# Altium footprint library 3.22-杂项.PcbLib: 199 footprints (part 14 of 15)
Each footprint in its own frame and in the unit in brackets; x right, y up, seen from the top. Pads: shape width x height; smd on the part's side, far side on the other; paste and mask are expansions set on the pad; w line width, h text height; cw(c..) or ccw(c..) is an arc to the next point about the centre after c.
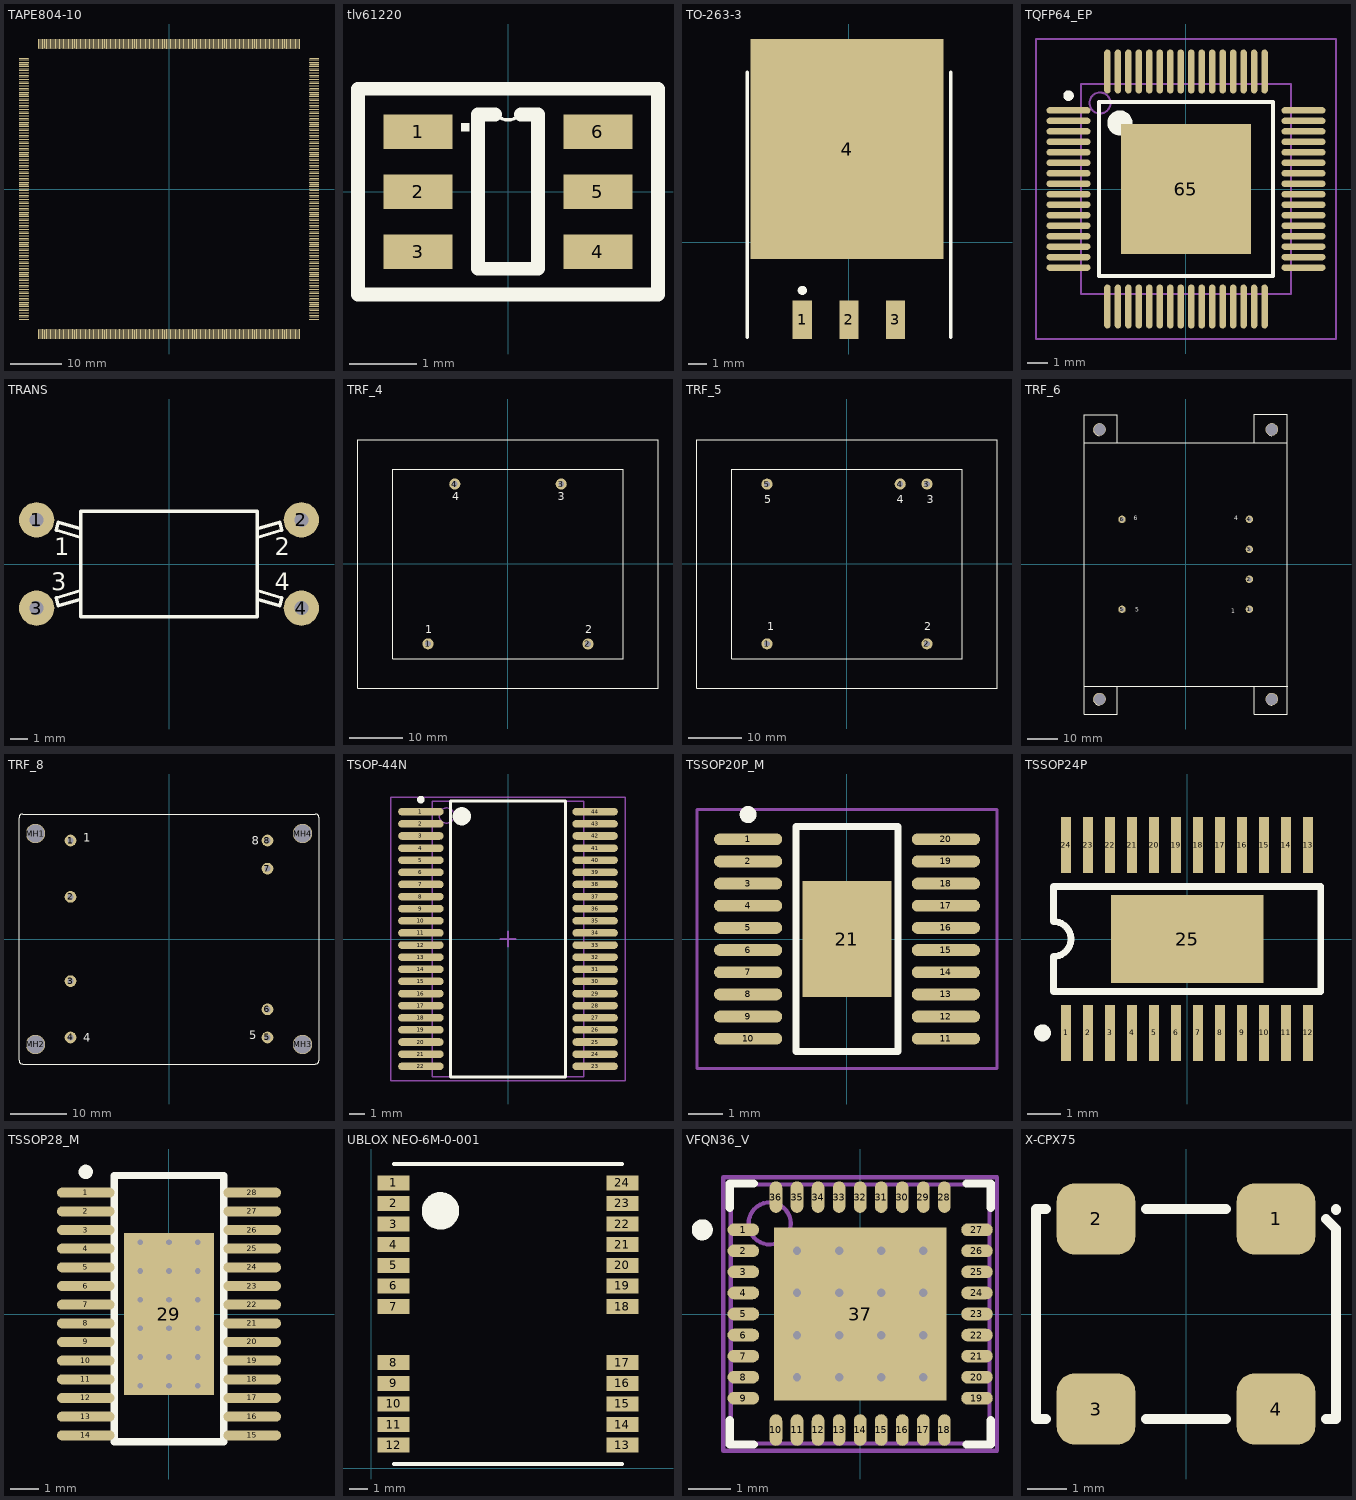
[diagram p13: the footprints below, top view; thin cyan lines are the x and y axes]

## TAPE804-10 [mil]
pads (804):
  oval 75x5 smd: 1(-1112.5,999.5) 2(-1112.5,989.5) 3(-1112.5,979.5) 4(-1112.5,969.5) 5(-1112.5,959.5) 6(-1112.5,949.5) 7(-1112.5,939.5) 8(-1112.5,929.5) 9(-1112.5,919.5) 10(-1112.5,909.5) 11(-1112.5,899.5) 12(-1112.5,889.5) 13(-1112.5,879.5) 14(-1112.5,869.5) 15(-1112.5,859.5) 16(-1112.5,849.5) 17(-1112.5,839.5) 18(-1112.5,829.5) 19(-1112.5,819.5) 20(-1112.5,809.5) 21(-1112.5,799.5) 22(-1112.5,789.5) 23(-1112.5,779.5) 24(-1112.5,769.5) 25(-1112.5,759.5) 26(-1112.5,749.5) 27(-1112.5,739.5) 28(-1112.5,729.5) 29(-1112.5,719.5) 30(-1112.5,709.5) 31(-1112.5,699.5) 32(-1112.5,689.5) 33(-1112.5,679.5) 34(-1112.5,669.5) 35(-1112.5,659.5) 36(-1112.5,649.5) 37(-1112.5,639.5) 38(-1112.5,629.5) 39(-1112.5,619.5) 40(-1112.5,609.5) 41(-1112.5,599.5) 42(-1112.5,589.5) 43(-1112.5,579.5) 44(-1112.5,569.5) 45(-1112.5,559.5) 46(-1112.5,549.5) 47(-1112.5,539.5) 48(-1112.5,529.5) 49(-1112.5,519.5) 50(-1112.5,509.5) 51(-1112.5,499.5) 52(-1112.5,489.5) 53(-1112.5,479.5) 54(-1112.5,469.5) 55(-1112.5,459.5) 56(-1112.5,449.5) 57(-1112.5,439.5) 58(-1112.5,429.5) 59(-1112.5,419.5) 60(-1112.5,409.5) 61(-1112.5,399.5) 62(-1112.5,389.5) 63(-1112.5,379.5) 64(-1112.5,369.5) 65(-1112.5,359.5) 66(-1112.5,349.5) 67(-1112.5,339.5) 68(-1112.5,329.5) 69(-1112.5,319.5) 70(-1112.5,309.5) 71(-1112.5,299.5) 72(-1112.5,289.5) 73(-1112.5,279.5) 74(-1112.5,269.5) 75(-1112.5,259.5) 76(-1112.5,249.5) 77(-1112.5,239.5) 78(-1112.5,229.5) 79(-1112.5,219.5) 80(-1112.5,209.5) 81(-1112.5,199.5) 82(-1112.5,189.5) 83(-1112.5,179.5) 84(-1112.5,169.5) 85(-1112.5,159.5) 86(-1112.5,149.5) 87(-1112.5,139.5) 88(-1112.5,129.5) 89(-1112.5,119.5) 90(-1112.5,109.5) 91(-1112.5,99.5) 92(-1112.5,89.5) 93(-1112.5,79.5) 94(-1112.5,69.5) 95(-1112.5,59.5) 96(-1112.5,49.5) 97(-1112.5,39.5) 98(-1112.5,29.5) 99(-1112.5,19.5) 100(-1112.5,9.5) 101(-1112.5,-0.5) 102(-1112.5,-10.5) 103(-1112.5,-20.5) 104(-1112.5,-30.5) 105(-1112.5,-40.5) 106(-1112.5,-50.5) 107(-1112.5,-60.5) 108(-1112.5,-70.5) 109(-1112.5,-80.5) 110(-1112.5,-90.5) 111(-1112.5,-100.5) 112(-1112.5,-110.5) 113(-1112.5,-120.5) 114(-1112.5,-130.5) 115(-1112.5,-140.5) 116(-1112.5,-150.5) 117(-1112.5,-160.5) 118(-1112.5,-170.5) 119(-1112.5,-180.5) 120(-1112.5,-190.5) 121(-1112.5,-200.5) 122(-1112.5,-210.5) 123(-1112.5,-220.5) 124(-1112.5,-230.5) 125(-1112.5,-240.5) 126(-1112.5,-250.5) 127(-1112.5,-260.5) 128(-1112.5,-270.5) 129(-1112.5,-280.5) 130(-1112.5,-290.5) 131(-1112.5,-300.5) 132(-1112.5,-310.5) 133(-1112.5,-320.5) 134(-1112.5,-330.5) 135(-1112.5,-340.5) 136(-1112.5,-350.5) 137(-1112.5,-360.5) 138(-1112.5,-370.5) 139(-1112.5,-380.5) 140(-1112.5,-390.5) 141(-1112.5,-400.5) 142(-1112.5,-410.5) 143(-1112.5,-420.5) 144(-1112.5,-430.5) 145(-1112.5,-440.5) 146(-1112.5,-450.5) 147(-1112.5,-460.5) 148(-1112.5,-470.5) 149(-1112.5,-480.5) 150(-1112.5,-490.5) 151(-1112.5,-500.5) 152(-1112.5,-510.5) 153(-1112.5,-520.5) 154(-1112.5,-530.5) 155(-1112.5,-540.5) 156(-1112.5,-550.5) 157(-1112.5,-560.5) 158(-1112.5,-570.5) 159(-1112.5,-580.5) 160(-1112.5,-590.5) 161(-1112.5,-600.5) 162(-1112.5,-610.5) 163(-1112.5,-620.5) 164(-1112.5,-630.5) 165(-1112.5,-640.5) 166(-1112.5,-650.5) 167(-1112.5,-660.5) 168(-1112.5,-670.5) 169(-1112.5,-680.5) 170(-1112.5,-690.5) 171(-1112.5,-700.5) 172(-1112.5,-710.5) 173(-1112.5,-720.5) 174(-1112.5,-730.5) 175(-1112.5,-740.5) 176(-1112.5,-750.5) 177(-1112.5,-760.5) 178(-1112.5,-770.5) 179(-1112.5,-780.5) 180(-1112.5,-790.5) 181(-1112.5,-800.5) 182(-1112.5,-810.5) 183(-1112.5,-820.5) 184(-1112.5,-830.5) 185(-1112.5,-840.5) 186(-1112.5,-850.5) 187(-1112.5,-860.5) 188(-1112.5,-870.5) 189(-1112.5,-880.5) 190(-1112.5,-890.5) 191(-1112.5,-900.5) 192(-1112.5,-910.5) 193(-1112.5,-920.5) 194(-1112.5,-930.5) 195(-1112.5,-940.5) 196(-1112.5,-950.5) 197(-1112.5,-960.5) 198(-1112.5,-970.5) 199(-1112.5,-980.5) 200(-1112.5,-990.5) 201(-1112.5,-1000.5) 403(1112.5,-1000.5) 404(1112.5,-990.5) 405(1112.5,-980.5) 406(1112.5,-970.5) 407(1112.5,-960.5) 408(1112.5,-950.5) 409(1112.5,-940.5) 410(1112.5,-930.5) 411(1112.5,-920.5) 412(1112.5,-910.5) 413(1112.5,-900.5) 414(1112.5,-890.5) 415(1112.5,-880.5) 416(1112.5,-870.5) 417(1112.5,-860.5) 418(1112.5,-850.5) 419(1112.5,-840.5) 420(1112.5,-830.5) 421(1112.5,-820.5) 422(1112.5,-810.5) 423(1112.5,-800.5) 424(1112.5,-790.5) 425(1112.5,-780.5) 426(1112.5,-770.5) 427(1112.5,-760.5) 428(1112.5,-750.5) 429(1112.5,-740.5) 430(1112.5,-730.5) 431(1112.5,-720.5) 432(1112.5,-710.5) 433(1112.5,-700.5) 434(1112.5,-690.5) 435(1112.5,-680.5) 436(1112.5,-670.5) 437(1112.5,-660.5) 438(1112.5,-650.5) 439(1112.5,-640.5) 440(1112.5,-630.5) 441(1112.5,-620.5) 442(1112.5,-610.5) 443(1112.5,-600.5) 444(1112.5,-590.5) 445(1112.5,-580.5) 446(1112.5,-570.5) 447(1112.5,-560.5) 448(1112.5,-550.5) 449(1112.5,-540.5) 450(1112.5,-530.5) 451(1112.5,-520.5) 452(1112.5,-510.5) 453(1112.5,-500.5) 454(1112.5,-490.5) 455(1112.5,-480.5) 456(1112.5,-470.5) 457(1112.5,-460.5) 458(1112.5,-450.5) 459(1112.5,-440.5) 460(1112.5,-430.5) 461(1112.5,-420.5) 462(1112.5,-410.5) 463(1112.5,-400.5) 464(1112.5,-390.5) 465(1112.5,-380.5) 466(1112.5,-370.5) 467(1112.5,-360.5) 468(1112.5,-350.5) 469(1112.5,-340.5) 470(1112.5,-330.5) 471(1112.5,-320.5) 472(1112.5,-310.5) 473(1112.5,-300.5) 474(1112.5,-290.5) 475(1112.5,-280.5) 476(1112.5,-270.5) 477(1112.5,-260.5) 478(1112.5,-250.5) 479(1112.5,-240.5) 480(1112.5,-230.5) 481(1112.5,-220.5) 482(1112.5,-210.5) 483(1112.5,-200.5) 484(1112.5,-190.5) 485(1112.5,-180.5) 486(1112.5,-170.5) 487(1112.5,-160.5) 488(1112.5,-150.5) 489(1112.5,-140.5) 490(1112.5,-130.5) 491(1112.5,-120.5) 492(1112.5,-110.5) 493(1112.5,-100.5) 494(1112.5,-90.5) 495(1112.5,-80.5) 496(1112.5,-70.5) 497(1112.5,-60.5) 498(1112.5,-50.5) 499(1112.5,-40.5) 500(1112.5,-30.5) 501(1112.5,-20.5) 502(1112.5,-10.5) 503(1112.5,-0.5) 504(1112.5,9.5) 505(1112.5,19.5) 506(1112.5,29.5) 507(1112.5,39.5) 508(1112.5,49.5) 509(1112.5,59.5) 510(1112.5,69.5) 511(1112.5,79.5) 512(1112.5,89.5) 513(1112.5,99.5) 514(1112.5,109.5) 515(1112.5,119.5) 516(1112.5,129.5) 517(1112.5,139.5) 518(1112.5,149.5) 519(1112.5,159.5) 520(1112.5,169.5) 521(1112.5,179.5) 522(1112.5,189.5) 523(1112.5,199.5) 524(1112.5,209.5) 525(1112.5,219.5) 526(1112.5,229.5) 527(1112.5,239.5) 528(1112.5,249.5) 529(1112.5,259.5) 530(1112.5,269.5) 531(1112.5,279.5) 532(1112.5,289.5) 533(1112.5,299.5) 534(1112.5,309.5) 535(1112.5,319.5) 536(1112.5,329.5) 537(1112.5,339.5) 538(1112.5,349.5) 539(1112.5,359.5) 540(1112.5,369.5) 541(1112.5,379.5) 542(1112.5,389.5) 543(1112.5,399.5) 544(1112.5,409.5) 545(1112.5,419.5) 546(1112.5,429.5) 547(1112.5,439.5) 548(1112.5,449.5) 549(1112.5,459.5) 550(1112.5,469.5) 551(1112.5,479.5) 552(1112.5,489.5) 553(1112.5,499.5) 554(1112.5,509.5) 555(1112.5,519.5) 556(1112.5,529.5) 557(1112.5,539.5) 558(1112.5,549.5) 559(1112.5,559.5) 560(1112.5,569.5) 561(1112.5,579.5) 562(1112.5,589.5) 563(1112.5,599.5) 564(1112.5,609.5) 565(1112.5,619.5) 566(1112.5,629.5) 567(1112.5,639.5) 568(1112.5,649.5) 569(1112.5,659.5) 570(1112.5,669.5) 571(1112.5,679.5) 572(1112.5,689.5) 573(1112.5,699.5) 574(1112.5,709.5) 575(1112.5,719.5) 576(1112.5,729.5) 577(1112.5,739.5) 578(1112.5,749.5) 579(1112.5,759.5) 580(1112.5,769.5) 581(1112.5,779.5) 582(1112.5,789.5) 583(1112.5,799.5) 584(1112.5,809.5) 585(1112.5,819.5) 586(1112.5,829.5) 587(1112.5,839.5) 588(1112.5,849.5) 589(1112.5,859.5) 590(1112.5,869.5) 591(1112.5,879.5) 592(1112.5,889.5) 593(1112.5,899.5) 594(1112.5,909.5) 595(1112.5,919.5) 596(1112.5,929.5) 597(1112.5,939.5) 598(1112.5,949.5) 599(1112.5,959.5) 600(1112.5,969.5) 601(1112.5,979.5) 602(1112.5,989.5) 603(1112.5,999.5)
  oval 5x75 smd: 202(-999.5,-1112.5) 203(-989.5,-1112.5) 204(-979.5,-1112.5) 205(-969.5,-1112.5) 206(-959.5,-1112.5) 207(-949.5,-1112.5) 208(-939.5,-1112.5) 209(-929.5,-1112.5) 210(-919.5,-1112.5) 211(-909.5,-1112.5) 212(-899.5,-1112.5) 213(-889.5,-1112.5) 214(-879.5,-1112.5) 215(-869.5,-1112.5) 216(-859.5,-1112.5) 217(-849.5,-1112.5) 218(-839.5,-1112.5) 219(-829.5,-1112.5) 220(-819.5,-1112.5) 221(-809.5,-1112.5) 222(-799.5,-1112.5) 223(-789.5,-1112.5) 224(-779.5,-1112.5) 225(-769.5,-1112.5) 226(-759.5,-1112.5) 227(-749.5,-1112.5) 228(-739.5,-1112.5) 229(-729.5,-1112.5) 230(-719.5,-1112.5) 231(-709.5,-1112.5) 232(-699.5,-1112.5) 233(-689.5,-1112.5) 234(-679.5,-1112.5) 235(-669.5,-1112.5) 236(-659.5,-1112.5) 237(-649.5,-1112.5) 238(-639.5,-1112.5) 239(-629.5,-1112.5) 240(-619.5,-1112.5) 241(-609.5,-1112.5) 242(-599.5,-1112.5) 243(-589.5,-1112.5) 244(-579.5,-1112.5) 245(-569.5,-1112.5) 246(-559.5,-1112.5) 247(-549.5,-1112.5) 248(-539.5,-1112.5) 249(-529.5,-1112.5) 250(-519.5,-1112.5) 251(-509.5,-1112.5) 252(-499.5,-1112.5) 253(-489.5,-1112.5) 254(-479.5,-1112.5) 255(-469.5,-1112.5) 256(-459.5,-1112.5) 257(-449.5,-1112.5) 258(-439.5,-1112.5) 259(-429.5,-1112.5) 260(-419.5,-1112.5) 261(-409.5,-1112.5) 262(-399.5,-1112.5) 263(-389.5,-1112.5) 264(-379.5,-1112.5) 265(-369.5,-1112.5) 266(-359.5,-1112.5) 267(-349.5,-1112.5) 268(-339.5,-1112.5) 269(-329.5,-1112.5) 270(-319.5,-1112.5) 271(-309.5,-1112.5) 272(-299.5,-1112.5) 273(-289.5,-1112.5) 274(-279.5,-1112.5) 275(-269.5,-1112.5) 276(-259.5,-1112.5) 277(-249.5,-1112.5) 278(-239.5,-1112.5) 279(-229.5,-1112.5) 280(-219.5,-1112.5) 281(-209.5,-1112.5) 282(-199.5,-1112.5) 283(-189.5,-1112.5) 284(-179.5,-1112.5) 285(-169.5,-1112.5) 286(-159.5,-1112.5) 287(-149.5,-1112.5) 288(-139.5,-1112.5) 289(-129.5,-1112.5) 290(-119.5,-1112.5) 291(-109.5,-1112.5) 292(-99.5,-1112.5) 293(-89.5,-1112.5) 294(-79.5,-1112.5) 295(-69.5,-1112.5) 296(-59.5,-1112.5) 297(-49.5,-1112.5) 298(-39.5,-1112.5) 299(-29.5,-1112.5) 300(-19.5,-1112.5) 301(-9.5,-1112.5) 302(0.5,-1112.5) 303(10.5,-1112.5) 304(20.5,-1112.5) 305(30.5,-1112.5) 306(40.5,-1112.5) 307(50.5,-1112.5) 308(60.5,-1112.5) 309(70.5,-1112.5) 310(80.5,-1112.5) 311(90.5,-1112.5) 312(100.5,-1112.5) 313(110.5,-1112.5) 314(120.5,-1112.5) 315(130.5,-1112.5) 316(140.5,-1112.5) 317(150.5,-1112.5) 318(160.5,-1112.5) 319(170.5,-1112.5) 320(180.5,-1112.5) 321(190.5,-1112.5) 322(200.5,-1112.5) 323(210.5,-1112.5) 324(220.5,-1112.5) 325(230.5,-1112.5) 326(240.5,-1112.5) 327(250.5,-1112.5) 328(260.5,-1112.5) 329(270.5,-1112.5) 330(280.5,-1112.5) 331(290.5,-1112.5) 332(300.5,-1112.5) 333(310.5,-1112.5) 334(320.5,-1112.5) 335(330.5,-1112.5) 336(340.5,-1112.5) 337(350.5,-1112.5) 338(360.5,-1112.5) 339(370.5,-1112.5) 340(380.5,-1112.5) 341(390.5,-1112.5) 342(400.5,-1112.5) 343(410.5,-1112.5) 344(420.5,-1112.5) 345(430.5,-1112.5) 346(440.5,-1112.5) 347(450.5,-1112.5) 348(460.5,-1112.5) 349(470.5,-1112.5) 350(480.5,-1112.5) 351(490.5,-1112.5) 352(500.5,-1112.5) 353(510.5,-1112.5) 354(520.5,-1112.5) 355(530.5,-1112.5) 356(540.5,-1112.5) 357(550.5,-1112.5) 358(560.5,-1112.5) 359(570.5,-1112.5) 360(580.5,-1112.5) 361(590.5,-1112.5) 362(600.5,-1112.5) 363(610.5,-1112.5) 364(620.5,-1112.5) 365(630.5,-1112.5) 366(640.5,-1112.5) 367(650.5,-1112.5) 368(660.5,-1112.5) 369(670.5,-1112.5) 370(680.5,-1112.5) 371(690.5,-1112.5) 372(700.5,-1112.5) 373(710.5,-1112.5) 374(720.5,-1112.5) 375(730.5,-1112.5) 376(740.5,-1112.5) 377(750.5,-1112.5) 378(760.5,-1112.5) 379(770.5,-1112.5) 380(780.5,-1112.5) 381(790.5,-1112.5) 382(800.5,-1112.5) 383(810.5,-1112.5) 384(820.5,-1112.5) 385(830.5,-1112.5) 386(840.5,-1112.5) 387(850.5,-1112.5) 388(860.5,-1112.5) 389(870.5,-1112.5) 390(880.5,-1112.5) 391(890.5,-1112.5) 392(900.5,-1112.5) 393(910.5,-1112.5) 394(920.5,-1112.5) 395(930.5,-1112.5) 396(940.5,-1112.5) 397(950.5,-1112.5) 398(960.5,-1112.5) 399(970.5,-1112.5) 400(980.5,-1112.5) 401(990.5,-1112.5) 402(1000.5,-1112.5) 604(1000.5,1112.5) 605(990.5,1112.5) 606(980.5,1112.5) 607(970.5,1112.5) 608(960.5,1112.5) 609(950.5,1112.5) 610(940.5,1112.5) 611(930.5,1112.5) 612(920.5,1112.5) 613(910.5,1112.5) 614(900.5,1112.5) 615(890.5,1112.5) 616(880.5,1112.5) 617(870.5,1112.5) 618(860.5,1112.5) 619(850.5,1112.5) 620(840.5,1112.5) 621(830.5,1112.5) 622(820.5,1112.5) 623(810.5,1112.5) 624(800.5,1112.5) 625(790.5,1112.5) 626(780.5,1112.5) 627(770.5,1112.5) 628(760.5,1112.5) 629(750.5,1112.5) 630(740.5,1112.5) 631(730.5,1112.5) 632(720.5,1112.5) 633(710.5,1112.5) 634(700.5,1112.5) 635(690.5,1112.5) 636(680.5,1112.5) 637(670.5,1112.5) 638(660.5,1112.5) 639(650.5,1112.5) 640(640.5,1112.5) 641(630.5,1112.5) 642(620.5,1112.5) 643(610.5,1112.5) 644(600.5,1112.5) 645(590.5,1112.5) 646(580.5,1112.5) 647(570.5,1112.5) 648(560.5,1112.5) 649(550.5,1112.5) 650(540.5,1112.5) 651(530.5,1112.5) 652(520.5,1112.5) 653(510.5,1112.5) 654(500.5,1112.5) 655(490.5,1112.5) 656(480.5,1112.5) 657(470.5,1112.5) 658(460.5,1112.5) 659(450.5,1112.5) 660(440.5,1112.5) 661(430.5,1112.5) 662(420.5,1112.5) 663(410.5,1112.5) 664(400.5,1112.5) 665(390.5,1112.5) 666(380.5,1112.5) 667(370.5,1112.5) 668(360.5,1112.5) 669(350.5,1112.5) 670(340.5,1112.5) 671(330.5,1112.5) 672(320.5,1112.5) 673(310.5,1112.5) 674(300.5,1112.5) 675(290.5,1112.5) 676(280.5,1112.5) 677(270.5,1112.5) 678(260.5,1112.5) 679(250.5,1112.5) 680(240.5,1112.5) 681(230.5,1112.5) 682(220.5,1112.5) 683(210.5,1112.5) 684(200.5,1112.5) 685(190.5,1112.5) 686(180.5,1112.5) 687(170.5,1112.5) 688(160.5,1112.5) 689(150.5,1112.5) 690(140.5,1112.5) 691(130.5,1112.5) 692(120.5,1112.5) 693(110.5,1112.5) 694(100.5,1112.5) 695(90.5,1112.5) 696(80.5,1112.5) 697(70.5,1112.5) 698(60.5,1112.5) 699(50.5,1112.5) 700(40.5,1112.5) 701(30.5,1112.5) 702(20.5,1112.5) 703(10.5,1112.5) 704(0.5,1112.5) 705(-9.5,1112.5) 706(-19.5,1112.5) 707(-29.5,1112.5) 708(-39.5,1112.5) 709(-49.5,1112.5) 710(-59.5,1112.5) 711(-69.5,1112.5) 712(-79.5,1112.5) 713(-89.5,1112.5) 714(-99.5,1112.5) 715(-109.5,1112.5) 716(-119.5,1112.5) 717(-129.5,1112.5) 718(-139.5,1112.5) 719(-149.5,1112.5) 720(-159.5,1112.5) 721(-169.5,1112.5) 722(-179.5,1112.5) 723(-189.5,1112.5) 724(-199.5,1112.5) 725(-209.5,1112.5) 726(-219.5,1112.5) 727(-229.5,1112.5) 728(-239.5,1112.5) 729(-249.5,1112.5) 730(-259.5,1112.5) 731(-269.5,1112.5) 732(-279.5,1112.5) 733(-289.5,1112.5) 734(-299.5,1112.5) 735(-309.5,1112.5) 736(-319.5,1112.5) 737(-329.5,1112.5) 738(-339.5,1112.5) 739(-349.5,1112.5) 740(-359.5,1112.5) 741(-369.5,1112.5) 742(-379.5,1112.5) 743(-389.5,1112.5) 744(-399.5,1112.5) 745(-409.5,1112.5) 746(-419.5,1112.5) 747(-429.5,1112.5) 748(-439.5,1112.5) 749(-449.5,1112.5) 750(-459.5,1112.5) 751(-469.5,1112.5) 752(-479.5,1112.5) 753(-489.5,1112.5) 754(-499.5,1112.5) 755(-509.5,1112.5) 756(-519.5,1112.5) 757(-529.5,1112.5) 758(-539.5,1112.5) 759(-549.5,1112.5) 760(-559.5,1112.5) 761(-569.5,1112.5) 762(-579.5,1112.5) 763(-589.5,1112.5) 764(-599.5,1112.5) 765(-609.5,1112.5) 766(-619.5,1112.5) 767(-629.5,1112.5) 768(-639.5,1112.5) 769(-649.5,1112.5) 770(-659.5,1112.5) 771(-669.5,1112.5) 772(-679.5,1112.5) 773(-689.5,1112.5) 774(-699.5,1112.5) 775(-709.5,1112.5) 776(-719.5,1112.5) 777(-729.5,1112.5) 778(-739.5,1112.5) 779(-749.5,1112.5) 780(-759.5,1112.5) 781(-769.5,1112.5) 782(-779.5,1112.5) 783(-789.5,1112.5) 784(-799.5,1112.5) 785(-809.5,1112.5) 786(-819.5,1112.5) 787(-829.5,1112.5) 788(-839.5,1112.5) 789(-849.5,1112.5) 790(-859.5,1112.5) 791(-869.5,1112.5) 792(-879.5,1112.5) 793(-889.5,1112.5) 794(-899.5,1112.5) 795(-909.5,1112.5) 796(-919.5,1112.5) 797(-929.5,1112.5) 798(-939.5,1112.5) 799(-949.5,1112.5) 800(-959.5,1112.5) 801(-969.5,1112.5) 802(-979.5,1112.5) 803(-989.5,1112.5) 804(-999.5,1112.5)

## tlv61220 [mil]
pads (6):
  rect 40x20 smd mask+2: 1(-52.5,35) 2(-52.5,0) 3(-52.5,-35) 4(52.5,-35) 5(52.5,0) 6(52.5,35)
Top Overlay:
  rectangle: -27.5,35 -22.5,40
  lines w2: -7.5,45 ccw(c0,52.5) 7.5,45
  lines w8: -7.5,45 -17.5,45 -17.5,-45 17.5,-45 17.5,45 7.5,45 ; -87.5,-60 87.5,-60 87.5,60 -87.5,60 -87.5,-60

## TO-263-3 [mm] "LM2940/LM1086"
height 4.65
pads (4):
  rect 1.05x2.1 smd: 1(-2.54,-4.225) 2(0,-4.225) 3(2.54,-4.225)
  rect 10.5x12 smd: 4(-0.104,5.08)
Top Overlay:
  circle w0.25: c-2.54,-2.625 r0.125
  lines w0.2: -5.55,-5.175 -5.55,9.275 ; 5.55,-5.175 5.55,9.275
3D body: height 0.8, standoff 0, extent 2.032,-4.699 3.048,-1.778
3D body: height 0.8, standoff 0, extent -0.508,-4.699 0.508,-1.778
3D body: height 0.8, standoff 0, extent -3.048,-4.699 -2.032,-1.778
3D body: height 1.6, standoff 0, extent -5.334,-1.778 5.334,9.271

## TQFP64_EP [mm]
height 1.2
pads (65):
  oval 2.1x0.3 smd: 1(-5.6,3.75) 2(-5.6,3.25) 3(-5.6,2.75) 4(-5.6,2.25) 5(-5.6,1.75) 6(-5.6,1.25) 7(-5.6,0.75) 8(-5.6,0.25) 9(-5.6,-0.25) 10(-5.6,-0.75) 11(-5.6,-1.25) 12(-5.6,-1.75) 13(-5.6,-2.25) 14(-5.6,-2.75) 15(-5.6,-3.25) 16(-5.6,-3.75) 33(5.6,-3.75) 34(5.6,-3.25) 35(5.6,-2.75) 36(5.6,-2.25) 37(5.6,-1.75) 38(5.6,-1.25) 39(5.6,-0.75) 40(5.6,-0.25) 41(5.6,0.25) 42(5.6,0.75) 43(5.6,1.25) 44(5.6,1.75) 45(5.6,2.25) 46(5.6,2.75) 47(5.6,3.25) 48(5.6,3.75)
  oval 0.3x2.1 smd: 17(-3.75,-5.6) 18(-3.25,-5.6) 19(-2.75,-5.6) 20(-2.25,-5.6) 21(-1.75,-5.6) 22(-1.25,-5.6) 23(-0.75,-5.6) 24(-0.25,-5.6) 25(0.25,-5.6) 26(0.75,-5.6) 27(1.25,-5.6) 28(1.75,-5.6) 29(2.25,-5.6) 30(2.75,-5.6) 31(3.25,-5.6) 32(3.75,-5.6) 49(3.75,5.6) 50(3.25,5.6) 51(2.75,5.6) 52(2.25,5.6) 53(1.75,5.6) 54(1.25,5.6) 55(0.75,5.6) 56(0.25,5.6) 57(-0.25,5.6) 58(-0.75,5.6) 59(-1.25,5.6) 60(-1.75,5.6) 61(-2.25,5.6) 62(-2.75,5.6) 63(-3.25,5.6) 64(-3.75,5.6)
  rect 6.2x6.2 smd: 65(0,0)
Top Overlay:
  circle w0.25: c-5.6,4.45 r0.125
  circle w0.6: c-3.15,3.15 r0.3
  lines w0.2: -4.15,-4.15 -4.15,4.15 4.15,4.15 4.15,-4.15 -4.15,-4.15
Mechanical 13:
  circle w0.1: c-4.1,4.1 r0.5
  lines w0.1: -5,-5 -5,5 5,5 5,-5 -5,-5
Mechanical 15:
  lines w0.1: -0.5,0 0.5,0 ; 0,-0.5 0,0.5 ; -7.15,-7.15 -7.15,7.15 7.15,7.15 7.15,-7.15 -7.15,-7.15
3D body: height 1.2, standoff 0, extent -5,-5 5,5

## TRANS [mm] "Transformer; 4 Leads"
pads (4):
  round 2 hole 0.8: 1(-7.5,2.5) 2(7.5,2.5) 3(-7.5,-2.5) 4(7.5,-2.5)
Top Overlay:
  lines w0.2: -5,-2 -6.275,-2.375 -6.4,-1.925 -5,-1.5 ; -5,1.5 -6.4,1.925 -6.275,2.375 -5,2 ; 5,-2 6.275,-2.375 6.4,-1.925 5,-1.5 ; 5,1.5 6.4,1.925 6.275,2.375 5,2 ; -5,-3 5,-3 5,3 -5,3 -5,-3
  text "1" at -6.5,0.5 h1
  text "2" at 6,0.5 h1
  text "3" at -6.675,-1.5 h1
  text "4" at 6,-1.5 h1

## TRF_4 [mil] "Variable Transformer; 4 Leads"
pads (4):
  round 82 hole 42: 1(-590.83,-590) 2(590.83,-590.83) 3(393.33,590.83) 4(-393.33,590.83)
Top Overlay:
  lines w8: -1108.33,-916.67 -1108.33,916.67 1108.33,916.67 1108.33,-916.67 -1108.33,-916.67 ; -850,-700 850,-700 850,700 -850,700 -850,-700
  text "3" at 369.17,470 h59.06
  text "4" at -410.83,470 h59.06
  text "2" at 569.17,-510 h59.06
  text "1" at -610.83,-510 h59.06

## TRF_5 [mil] "Center-Tapped Transformer (Coupled Inductor Model); 5 Leads"
pads (5):
  round 82 hole 42: 1(-590.83,-590.42) 2(590.83,-590.42) 3(590.83,590.42) 4(393.33,590.42) 5(-590.83,589.58)
Top Overlay:
  lines w8: -1108.33,-917.08 -1108.33,916.25 1108.33,916.25 1108.33,-917.08 -1108.33,-917.08 ; -850,-700.42 850,-700.42 850,699.58 -850,699.58 -850,-700.42
  text "5" at -610.83,449.58 h59.06
  text "1" at -590.83,-490.42 h59.06
  text "4" at 369.17,449.58 h59.06
  text "3" at 589.17,449.58 h59.06
  text "2" at 569.17,-490.42 h59.06

## TRF_6 [mil] "Three-winding Transformer (Non-Ideal); 6 Leads"
pads (10):
  round 98 hole 52: 1(836.67,-590.83) 2(836.67,-196.67) 3(836.67,196.67) 4(836.67,590.83) 5(-836.67,-590.83) 6(-836.67,590.83)
  round 165 hole 152: MH1(-1131.67,-1771.67) MH2(1131.67,-1771.67) MH3(1131.67,1771.67) MH4(-1131.67,1771.67)
Top Overlay:
  lines w8: -1333.33,-1600 1341.67,-1600 ; -1333.33,1600 1333.33,1600 ; -1133.33,-1850 cw(c-1133.33,-1775) -1133.33,-1700 ; -1133.33,1691.67 cw(c-1133.33,1766.67) -1133.33,1841.67 ; -900,-1600 -900,-1966.67 -1333.33,-1966.67 -1333.33,1966.67 -900,1966.67 -900,1600 ; 900,-1600 900,-1966.67 1333.33,-1966.67 1333.33,1966.67 ; 900,1600 900,1975 1333.33,1975 ; 1133.33,-1850 cw(c1133.33,-1775) 1133.33,-1700 ; 1133.33,1691.67 cw(c1133.33,1766.67) 1133.33,1841.67
  text "6" at -680,580 h59.06
  text "4" at 640,580 h59.06
  text "1" at 600,-640 h59.06
  text "5" at -660,-620 h59.06

## TRF_8 [mil] "Buck-boost Transformer (Ideal); 8 Leads"
pads (12):
  round 82 hole 42: 1(-689.17,689.17) 2(-689.17,295) 3(-689.17,-295) 4(-689.17,-689.17) 5(689.17,-689.17) 6(689.17,-492.5) 7(689.17,492.5) 8(689.17,689.17)
  round 135 hole 125: MH1(-935,738.33) MH2(-935,-738.33) MH3(935,-738.33) MH4(935,738.33)
Top Overlay:
  lines w8: -1050,-850 ccw(c-1025,-850) -1025,-875 1025,-875 ccw(c1025,-850) 1050,-850 1050,850 ccw(c1025,850) 1025,875 -1025,875 ccw(c-1025,850) -1050,850 -1050,-850
  text "1" at -600,680 h59.06
  text "5" at 560,-700 h59.06
  text "8" at 580,660 h59.06
  text "4" at -600,-720 h59.06

## TSOP-44N [mm] "TSOP, 44-Leads, Body 18.2x10.0mm (max), Pitch 0.80mm, IPC Medium Density"
height 1.2
pads (44):
  oval 3x0.5 smd: 1(-5.75,8.4) 2(-5.75,7.6) 3(-5.75,6.8) 4(-5.75,6) 5(-5.75,5.2) 6(-5.75,4.4) 7(-5.75,3.6) 8(-5.75,2.8) 9(-5.75,2) 10(-5.75,1.2) 11(-5.75,0.4) 12(-5.75,-0.4) 13(-5.75,-1.2) 14(-5.75,-2) 15(-5.75,-2.8) 16(-5.75,-3.6) 17(-5.75,-4.4) 18(-5.75,-5.2) 19(-5.75,-6) 20(-5.75,-6.8) 21(-5.75,-7.6) 22(-5.75,-8.4) 23(5.75,-8.4) 24(5.75,-7.6) 25(5.75,-6.8) 26(5.75,-6) 27(5.75,-5.2) 28(5.75,-4.4) 29(5.75,-3.6) 30(5.75,-2.8) 31(5.75,-2) 32(5.75,-1.2) 33(5.75,-0.4) 34(5.75,0.4) 35(5.75,1.2) 36(5.75,2) 37(5.75,2.8) 38(5.75,3.6) 39(5.75,4.4) 40(5.75,5.2) 41(5.75,6) 42(5.75,6.8) 43(5.75,7.6) 44(5.75,8.4)
Top Overlay:
  circle w0.6: c-3.05,8.1 r0.3
  circle w0.25: c-5.75,9.2 r0.125
  lines w0.2: -3.81,-9.1 3.81,-9.1 3.81,9.1 -3.81,9.1 -3.81,-9.1
Mechanical 13:
  circle w0.1: c-4.05,8.15 r0.5
  lines w0.1: -5,-9.1 5,-9.1 5,9.1 -5,9.1 -5,-9.1
Mechanical 15:
  lines w0.1: -0.5,0 0.5,0 ; 0,-0.5 0,0.5 ; -7.747,-9.35 7.747,-9.35 7.747,9.35 -7.747,9.35 -7.747,-9.35
3D body: height 1.2, standoff 0.2, extent -5,-9.1 5,9.1

## TSSOP20P_M [mm] "TSOP, 20-Leads, Body 6.5x4.4mm, Pitch 0.65mm, IPC Low Density"
height 1.1
pads (21):
  oval 2x0.35 smd: 1(-2.9,2.925) 2(-2.9,2.275) 3(-2.9,1.625) 4(-2.9,0.975) 5(-2.9,0.325) 6(-2.9,-0.325) 7(-2.9,-0.975) 8(-2.9,-1.625) 9(-2.9,-2.275) 10(-2.9,-2.925) 11(2.9,-2.925) 12(2.9,-2.275) 13(2.9,-1.625) 14(2.9,-0.975) 15(2.9,-0.325) 16(2.9,0.325) 17(2.9,0.975) 18(2.9,1.625) 19(2.9,2.275) 20(2.9,2.925)
  rect 2.6x3.4 smd: 21(0,0)
Top Overlay:
  circle w0.25: c-2.9,3.65 r0.125
  lines w0.2: -1.5,-3.3 -1.5,3.3 1.5,3.3 1.5,-3.3 -1.5,-3.3
Mechanical 15:
  lines w0.1: -4.4,-3.8 -4.4,3.8 4.4,3.8 4.4,-3.8 -4.4,-3.8

## TSSOP24P [mm] "Shrink Small Outline; 24 Leads; Body Width 4.4 mm; Pitch 0.65 mm"
height 1.2
pads (25):
  rect 0.3x1.65 smd: 1(-3.575,-2.775) 2(-2.925,-2.775) 3(-2.275,-2.775) 4(-1.625,-2.775) 5(-0.975,-2.775) 6(-0.325,-2.775) 7(0.325,-2.775) 8(0.975,-2.775) 9(1.625,-2.775) 10(2.275,-2.775) 11(2.925,-2.775) 12(3.575,-2.775) 13(3.575,2.775) 14(2.925,2.775) 15(2.275,2.775) 16(1.625,2.775) 17(0.975,2.775) 18(0.325,2.775) 19(-0.325,2.775) 20(-0.975,2.775) 21(-1.625,2.775) 22(-2.275,2.775) 23(-2.925,2.775) 24(-3.575,2.775)
  rect 4.5x2.6 smd: 25(0,0)
Top Overlay:
  circle w0.25: c-4.275,-2.775 r0.125
  lines w0.2: -3.95,-1.55 -3.95,-0.517 ccw(c-3.95,0) -3.95,0.517 -3.95,1.55 3.95,1.55 3.95,-1.55 -3.95,-1.55

## TSSOP28_M [mm]
pads (29):
  oval 2x0.35 smd: 1(-2.9,4.225) 2(-2.9,3.575) 3(-2.9,2.925) 4(-2.9,2.275) 5(-2.9,1.625) 6(-2.9,0.975) 7(-2.9,0.325) 8(-2.9,-0.325) 9(-2.9,-0.975) 10(-2.9,-1.625) 11(-2.9,-2.275) 12(-2.9,-2.925) 13(-2.9,-3.575) 14(-2.9,-4.225) 15(2.9,-4.225) 16(2.9,-3.575) 17(2.9,-2.925) 18(2.9,-2.275) 19(2.9,-1.625) 20(2.9,-0.975) 21(2.9,-0.325) 22(2.9,0.325) 23(2.9,0.975) 24(2.9,1.625) 25(2.9,2.275) 26(2.9,2.925) 27(2.9,3.575) 28(2.9,4.225)
  rect 3.15x5.65 smd: 29(0,0)
via 1,2.5 diameter 0.4 hole 0.2
via 0,2.5 diameter 0.4 hole 0.2
via -1,2.5 diameter 0.4 hole 0.2
via -1,0.5 diameter 0.4 hole 0.2
via -1,-0.5 diameter 0.4 hole 0.2
via -1,-1.5 diameter 0.4 hole 0.2
via -1,1.5 diameter 0.4 hole 0.2
via -1,-2.5 diameter 0.4 hole 0.2
via 0,-2.5 diameter 0.4 hole 0.2
via 1,-2.5 diameter 0.4 hole 0.2
via 0,1.5 diameter 0.4 hole 0.2
via 1,1.5 diameter 0.4 hole 0.2
via 1,-1.5 diameter 0.4 hole 0.2
via 0,-1.5 diameter 0.4 hole 0.2
via 1,-0.5 diameter 0.4 hole 0.2
via 0,-0.5 diameter 0.4 hole 0.2
via 1,0.5 diameter 0.4 hole 0.2
via 0,0.5 diameter 0.4 hole 0.2
Top Overlay:
  circle w0.25: c-2.9,4.95 r0.125
  lines w0.254: -1.905,-4.445 1.905,-4.445 1.905,4.826 -1.905,4.826 -1.905,-4.445

## UBLOX NEO-6M-0-001 [mm]
pads (24):
  rect 1.7x0.8 smd: 1(1.199,15.223) 2(1.199,14.123) 3(1.199,13.023) 4(1.199,11.923) 5(1.199,10.823) 6(1.199,9.723) 7(1.199,8.623) 8(1.199,5.623) 9(1.199,4.523) 10(1.199,3.423) 11(1.199,2.323) 12(1.199,1.223) 13(13.399,1.223) 14(13.399,2.323) 15(13.399,3.423) 16(13.399,4.523) 17(13.399,5.623) 18(13.399,8.623) 19(13.399,9.723) 20(13.399,10.823) 21(13.399,11.923) 22(13.399,13.023) 23(13.399,14.123) 24(13.399,15.223)
Top Overlay:
  circle w1: c3.699,13.723 r0.5
  lines w0.2: 1.199,0.223 13.399,0.223 ; 1.199,16.223 13.399,16.223
3D body: height 2.4, standoff 0.82, extent 2.199,1.223 12.399,15.223
3D body: height 0.82, standoff 0.01, extent 1.199,0.223 13.399,16.223

## VFQN36_V [mm] "QFN, 36-Leads, Body 6x6mm, Pitch 0.5mm, ST Recommended"
height 1
pads (37):
  oval 0.75x0.3 smd: 1(-2.775,2) 2(-2.775,1.5) 3(-2.775,1) 4(-2.775,0.5) 5(-2.775,0) 6(-2.775,-0.5) 7(-2.775,-1) 8(-2.775,-1.5) 9(-2.775,-2) 19(2.775,-2) 20(2.775,-1.5) 21(2.775,-1) 22(2.775,-0.5) 23(2.775,0) 24(2.775,0.5) 25(2.775,1) 26(2.775,1.5) 27(2.775,2)
  oval 0.3x0.75 smd: 10(-2,-2.755) 11(-1.5,-2.755) 12(-1,-2.755) 13(-0.5,-2.755) 14(0,-2.755) 15(0.5,-2.755) 16(1,-2.755) 17(1.5,-2.755) 18(2,-2.755) 28(2,2.775) 29(1.5,2.775) 30(1,2.775) 31(0.5,2.775) 32(0,2.775) 33(-0.5,2.775) 34(-1,2.775) 35(-1.5,2.775) 36(-2,2.775)
  rect 4.1x4.1 smd: 37(0,0)
via 1.5,-1.5 diameter 0.4 hole 0.2
via 0.5,-1.5 diameter 0.4 hole 0.2
via -0.5,-1.5 diameter 0.4 hole 0.2
via -1.5,-1.5 diameter 0.4 hole 0.2
via 1.5,-0.5 diameter 0.4 hole 0.2
via 0.5,-0.5 diameter 0.4 hole 0.2
via -0.5,-0.5 diameter 0.4 hole 0.2
via -1.5,-0.5 diameter 0.4 hole 0.2
via 1.5,0.5 diameter 0.4 hole 0.2
via 0.5,0.5 diameter 0.4 hole 0.2
via -0.5,0.5 diameter 0.4 hole 0.2
via -1.5,0.5 diameter 0.4 hole 0.2
via 1.5,1.5 diameter 0.4 hole 0.2
via 0.5,1.5 diameter 0.4 hole 0.2
via -0.5,1.5 diameter 0.4 hole 0.2
via -1.5,1.5 diameter 0.4 hole 0.2
Top Overlay:
  circle w0.25: c-3.75,2 r0.125
  lines w0.2: -3.1,-2.525 -3.1,-3.1 -2.525,-3.1 ; -3.1,2.525 -3.1,3.1 -2.525,3.1 ; 2.525,-3.1 3.1,-3.1 3.1,-2.525 ; 2.525,3.1 3.1,3.1 3.1,2.525
Mechanical 13:
  circle w0.1: c-2.15,2.15 r0.5
  lines w0.1: -3.075,3.05 -3.075,-3.075 3.075,-3.075 3.075,3.075 -3.075,3.075
Mechanical 15:
  lines w0.1: -0.5,0 0.5,0 ; 0,-0.5 0,0.5 ; -3.25,-3.25 3.25,-3.25 3.25,3.25 -3.25,3.25 -3.25,-3.25
3D body: height 1, standoff 0, extent -3.05,-3.05 3.05,3.05

## X-CPX75 [mm]
height 14.8
pads (4):
  rrect50% 2x1.8 smd: 1(2.281,2.415) 2(-2.291,2.415) 3(-2.291,-2.411) 4(2.281,-2.411)
Top Overlay:
  lines w0.254: -3.561,-2.665 -3.815,-2.665 -3.815,2.669 -3.561,2.669 ; -1.021,-2.665 1.011,-2.665 ; -1.021,2.669 1.011,2.669 ; 3.551,-2.665 3.805,-2.665 3.805,2.161 3.551,2.415 ; 3.805,2.644 3.805,2.669